# Altium footprint library ICs And Semiconductors SMD.PcbLib: 943 footprints (part 13 of 60) (continued)
## MARKI-MICROWAVE_EZ-Style Doubler [mm] "Marki microwave EZ Style Doubler Outline, 15.24mm L X 8.13mm W X 4.3mm H Body" (continued)
  text "F" at -9.7,-0.6 h1.2
Mechanical 15:
  lines w0.05: -8.378,-4.822 8.378,-4.822 8.378,4.822 -8.378,4.822 -8.378,-4.822
Drill Drawing:
  lines w0.1: -7.62,-4.064 7.62,-4.064 7.62,4.064 -7.62,4.064 -7.62,-4.064
  text "Filled and Capped Via Area" at -7.5,4.4 h0.6
  text "(D=0.35mm)" at -2.3,-3.1 h0.6
3D body "MARKI-MICROWAVE_EZ-Style Doubler.stp": height 4.3, standoff 0, extent -7.62,-4.064 7.62,4.064

## MARKI-MICROWAVE_EZ-Style Mixer [mm] "Marki microwave EZ Style Mixer Outline, 15.24mm L X 8.13mm W X 4.3mm H Body"
height 4.3
pads (18):
  rect 0.889x0.508 smd: 1(-7.683,0) 2(7.684,0)
  rect 0.508x0.889 smd: 3(0,-4.128)
  round 2.35 hole 1.85: 4(-6.35,-2.794) 4(-6.35,2.794) 4(-3.429,-1.27) 4(-3.429,1.27) 4(0,-1.27) 4(0,1.27) 4(3.429,-1.27) 4(3.429,1.27) 4(6.35,-2.794) 4(6.35,2.794)
  rect 7.366x3.81 smd: 4(-4.445,-2.667) 4(4.445,-2.667)
  rect 1.524x2.54 smd: 4(0,-2.032)
  rect 13.716x1.524 smd: 4(0,0)
  rect 16.256x3.81 smd: 4(0,2.667)
via -6.477,1.524 diameter 0.6 hole 0.35
via -7.239,1.905 diameter 0.6 hole 0.35
via -7.239,1.143 diameter 0.6 hole 0.35
via -6.477,0.762 diameter 0.6 hole 0.35
via -6.477,0 diameter 0.6 hole 0.35
via -6.477,-0.762 diameter 0.6 hole 0.35
via -7.239,-1.143 diameter 0.6 hole 0.35
via -6.477,-1.524 diameter 0.6 hole 0.35
via -7.239,-1.905 diameter 0.6 hole 0.35
via -4.953,-3.683 diameter 0.6 hole 0.35
via -4.191,-3.683 diameter 0.6 hole 0.35
via -3.429,-3.683 diameter 0.6 hole 0.35
via -2.667,-3.683 diameter 0.6 hole 0.35
via -1.905,-3.683 diameter 0.6 hole 0.35
via -1.143,-3.683 diameter 0.6 hole 0.35
via -1.524,-2.921 diameter 0.6 hole 0.35
via -0.762,-2.921 diameter 0.6 hole 0.35
via 0,-2.921 diameter 0.6 hole 0.35
via 0.762,-2.921 diameter 0.6 hole 0.35
via 1.524,-2.921 diameter 0.6 hole 0.35
via 1.143,-3.683 diameter 0.6 hole 0.35
via 1.905,-3.683 diameter 0.6 hole 0.35
via 2.667,-3.683 diameter 0.6 hole 0.35
via 3.429,-3.683 diameter 0.6 hole 0.35
via 4.191,-3.683 diameter 0.6 hole 0.35
via 4.953,-3.683 diameter 0.6 hole 0.35
via 7.239,-1.905 diameter 0.6 hole 0.35
via 6.477,-1.524 diameter 0.6 hole 0.35
via 7.239,-1.143 diameter 0.6 hole 0.35
via 6.477,-0.762 diameter 0.6 hole 0.35
via 6.477,0 diameter 0.6 hole 0.35
via 6.477,0.762 diameter 0.6 hole 0.35
via 6.477,1.524 diameter 0.6 hole 0.35
via 7.239,1.143 diameter 0.6 hole 0.35
via 7.239,1.905 diameter 0.6 hole 0.35
via 4.953,3.683 diameter 0.6 hole 0.35
via 4.191,3.683 diameter 0.6 hole 0.35
via 3.429,3.683 diameter 0.6 hole 0.35
via 2.667,3.683 diameter 0.6 hole 0.35
via 1.905,3.683 diameter 0.6 hole 0.35
via 1.143,3.683 diameter 0.6 hole 0.35
via -1.143,3.683 diameter 0.6 hole 0.35
via -1.905,3.683 diameter 0.6 hole 0.35
via -2.667,3.683 diameter 0.6 hole 0.35
via -3.429,3.683 diameter 0.6 hole 0.35
via -4.191,3.683 diameter 0.6 hole 0.35
via -4.953,3.683 diameter 0.6 hole 0.35
via -0.381,3.683 diameter 0.6 hole 0.35
via 0.381,3.683 diameter 0.6 hole 0.35
Top Layer:
  region: -8.128,-4.572 -8.128,-0.762 -6.858,-0.762 -6.858,0.762 -8.128,0.762 -8.128,4.572 8.128,4.572 8.128,0.762 6.858,0.762 6.858,-0.762 8.128,-0.762 8.128,-4.572 0.762,-4.572 0.762,-3.302 -0.762,-3.302 -0.762,-4.572
Top Overlay:
  lines w0.2: -8.428,-0.762 -8.428,-4.872 -0.762,-4.872 ; -8.428,0.762 -8.428,4.872 8.428,4.872 8.428,0.762 ; 0.762,-4.872 8.428,-4.872 8.428,-0.762
  text "R" at 9,-0.6 h1.2
  text "L" at -9.8,-0.6 h1.2
  text "I2" at -0.9,-6.6 h1.2
Mechanical 8:
  drawing of 293 lines, arcs and shapes, not listed
Mechanical 14:
  circle w0.1: c-6.35,2.794 r0.925
  circle w0.1: c6.35,-2.794 r0.925
  circle w0.1: c-6.35,-2.794 r1.2
  circle w0.1: c6.35,2.794 r1.2
  lines w0.1: -7.62,-1.394 -6.35,-1.394 cw(c-6.35,-2.794) -4.95,-2.794 -4.95,-4.064 ; -7.62,-1.394 -7.62,1.394 ; -7.62,-1.394 -7.62,-2.794 ccw(c-6.35,-2.794) -6.35,-4.064 -4.95,-4.064 ; -7.62,1.394 -7.62,2.794 cw(c-6.35,2.794) -6.35,4.064 -4.95,4.064 ; -7.62,1.394 -6.35,1.394 ccw(c-6.35,2.794) -4.95,2.794 -4.95,4.064 ; -4.95,-4.064 4.95,-4.064 ; -4.95,4.064 4.95,4.064 ; 4.95,-4.064 6.35,-4.064 ccw(c6.35,-2.794) 7.62,-2.794 7.62,-1.394 ; 4.95,-4.064 4.95,-2.794 cw(c6.35,-2.794) 6.35,-1.394 7.62,-1.394 ; 4.95,4.064 4.95,2.794 ccw(c6.35,2.794) 6.35,1.394 7.62,1.394 ; 4.95,4.064 6.35,4.064 cw(c6.35,2.794) 7.62,2.794 7.62,1.394 ; 7.62,-1.394 7.62,1.394 ; -7.123,-3.24 -7.123,-2.348 -6.35,-1.902 -5.577,-2.348 -5.577,-3.24 -6.35,-3.686 -7.123,-3.24 ; 5.577,2.348 5.577,3.24 6.35,3.686 7.123,3.24 7.123,2.348 6.35,1.902 5.577,2.348
  text "L" at -9.8,-0.6 h1.2
  text "R" at 9,-0.6 h1.2
  text "I2" at -0.9,-6.6 h1.2
Mechanical 15:
  lines w0.05: -8.378,-4.822 8.378,-4.822 8.378,4.822 -8.378,4.822 -8.378,-4.822
Drill Drawing:
  lines w0.1: -7.62,-4.064 7.62,-4.064 7.62,4.064 -7.62,4.064 -7.62,-4.064
  text "(D=0.35mm)" at -2.8,2.6 h0.6
  text "Filled and Capped Via Area" at -7.5,4.4 h0.6
3D body "MARKI-MICROWAVE_EZ-Style Mixer.stp": height 4.3, standoff 0, extent -7.62,-4.064 7.62,4.064

## MARKI-MICROWAVE_FLSM1000 [mm] "Marki microwave Case FLSM1000, 25.4mm L X 8.13mm W X 2.794mm H Body"
height 2.794
pads (9):
  round 0.762 smd: 1(-12.446,0) 2(12.446,0)
  round 2.3 hole 1.6: 3(-11.43,-2.795) 3(-11.43,2.795) 3(11.43,-2.795) 3(11.43,2.795)
  rect 26.416x3.937 smd: 3(0,-2.604) 3(0,2.604)
  rect 23.622x1.27 smd: 3(0,0)
via -10.16,3.937 diameter 1.05 hole 0.75
via -7.62,3.937 diameter 1.05 hole 0.75
via -5.08,3.937 diameter 1.05 hole 0.75
via -2.54,3.937 diameter 1.05 hole 0.75
via 0,3.937 diameter 1.05 hole 0.75
via 2.54,3.937 diameter 1.05 hole 0.75
via 5.08,3.937 diameter 1.05 hole 0.75
via 7.62,3.937 diameter 1.05 hole 0.75
via 10.16,3.937 diameter 1.05 hole 0.75
via 8.89,2.032 diameter 1.05 hole 0.75
via 6.35,2.032 diameter 1.05 hole 0.75
via 3.81,2.032 diameter 1.05 hole 0.75
via 1.27,2.032 diameter 1.05 hole 0.75
via -1.27,2.032 diameter 1.05 hole 0.75
via -3.81,2.032 diameter 1.05 hole 0.75
via -6.35,2.032 diameter 1.05 hole 0.75
via -8.89,2.032 diameter 1.05 hole 0.75
via -11.43,1.016 diameter 1.05 hole 0.75
via -10.16,0 diameter 1.05 hole 0.75
via -7.62,0 diameter 1.05 hole 0.75
via -5.08,0 diameter 1.05 hole 0.75
via -2.54,0 diameter 1.05 hole 0.75
via 0,0 diameter 1.05 hole 0.75
via 2.54,0 diameter 1.05 hole 0.75
via 5.08,0 diameter 1.05 hole 0.75
via 7.62,0 diameter 1.05 hole 0.75
via 10.16,0 diameter 1.05 hole 0.75
via 11.43,1.016 diameter 1.05 hole 0.75
via 11.43,-1.016 diameter 1.05 hole 0.75
via 8.89,-2.032 diameter 1.05 hole 0.75
via 6.35,-2.032 diameter 1.05 hole 0.75
via 3.81,-2.032 diameter 1.05 hole 0.75
via 1.27,-2.032 diameter 1.05 hole 0.75
via -1.27,-2.032 diameter 1.05 hole 0.75
via -3.81,-2.032 diameter 1.05 hole 0.75
via -6.35,-2.032 diameter 1.05 hole 0.75
via -8.89,-2.032 diameter 1.05 hole 0.75
via -11.43,-1.016 diameter 1.05 hole 0.75
via -10.16,-3.937 diameter 1.05 hole 0.75
via -7.62,-3.937 diameter 1.05 hole 0.75
via -5.08,-3.937 diameter 1.05 hole 0.75
via -2.54,-3.937 diameter 1.05 hole 0.75
via 0,-3.937 diameter 1.05 hole 0.75
via 2.54,-3.937 diameter 1.05 hole 0.75
via 5.08,-3.937 diameter 1.05 hole 0.75
via 7.62,-3.937 diameter 1.05 hole 0.75
via 10.16,-3.937 diameter 1.05 hole 0.75
Top Layer:
  region: -13.208,-4.572 -13.208,-0.635 -12.446,-0.635 -12.322,-0.623 -12.093,-0.528 -11.918,-0.353 -11.823,-0.124 -11.823,0.124 -11.918,0.353 -12.093,0.528 -12.322,0.623 -12.446,0.635 -13.208,0.635 -13.208,4.572 13.208,4.572 13.208,0.635 12.446,0.635 12.322,0.623 12.093,0.528 11.918,0.353 11.823,0.124 11.823,-0.124 11.918,-0.353 12.093,-0.528 12.322,-0.623 12.446,-0.635 13.208,-0.635 13.208,-4.572
Top Overlay:
  lines w0.2: -13.508,-0.635 -13.508,-4.872 13.508,-4.872 13.508,-0.635 ; -13.508,0.635 -13.508,4.872 13.508,4.872 13.508,0.635
Mechanical 8:
  drawing of 231 lines, arcs and shapes, not listed
Mechanical 14:
  circle w0.1: c11.43,2.795 r0.762
  circle w0.1: c11.43,-2.795 r0.762
  circle w0.1: c-11.43,-2.795 r0.762
  circle w0.1: c-11.43,2.795 r0.762
  lines w0.1: -12.7,-3.465 ccw(c-12.1,-3.465) -12.1,-4.065 12.1,-4.065 ccw(c12.1,-3.465) 12.7,-3.465 12.7,-0.635 12.446,-0.635 cw(c12.446,0) 12.446,0.635 12.7,0.635 12.7,3.465 ccw(c12.1,3.465) 12.1,4.065 -12.1,4.065 ccw(c-12.1,3.465) -12.7,3.465 -12.7,0.635 -12.446,0.635 cw(c-12.446,0) -12.446,-0.635 -12.7,-0.635 -12.7,-3.465
Mechanical 15:
  lines w0.05: -13.458,-4.822 13.458,-4.822 13.458,4.822 -13.458,4.822 -13.458,-4.822
Drill Drawing:
  lines w0.1: -13.208,-4.572 -13.208,4.572 13.208,4.572 13.208,-4.572 -13.208,-4.572
  text "Filled and Capped Via (0.75mm) Area" at -10.1,2.7 h0.6
3D body "MARKI-MICROWAVE_FLSM1000.stp": height 2.79, standoff 0, extent -12.7,-4.065 12.7,4.065

## MARKI-MICROWAVE_FLSM1600 [mm] "Marki microwave Case FLSM1600, 40.64mm L X 8.13mm W X 2.794mm H Body"
height 2.794
pads (9):
  round 0.762 smd: 1(-20.066,0) 2(20.066,0)
  round 2.3 hole 1.6: 3(-19.05,-2.795) 3(-19.05,2.795) 3(19.05,-2.795) 3(19.05,2.795)
  rect 41.656x3.937 smd: 3(0,-2.604) 3(0,2.604)
  rect 38.883x1.27 smd: 3(0,0)
via 17.145,-3.937 diameter 1.05 hole 0.75
via 13.335,-3.937 diameter 1.05 hole 0.75
via 9.525,-3.937 diameter 1.05 hole 0.75
via 5.715,-3.937 diameter 1.05 hole 0.75
via 1.905,-3.937 diameter 1.05 hole 0.75
via -1.905,-3.937 diameter 1.05 hole 0.75
via -5.715,-3.937 diameter 1.05 hole 0.75
via -9.525,-3.937 diameter 1.05 hole 0.75
via -13.335,-3.937 diameter 1.05 hole 0.75
via -17.145,-3.937 diameter 1.05 hole 0.75
via -15.24,-2.032 diameter 1.05 hole 0.75
via -11.43,-2.032 diameter 1.05 hole 0.75
via -7.62,-2.032 diameter 1.05 hole 0.75
via -3.81,-2.032 diameter 1.05 hole 0.75
via -0.5,-2.032 diameter 1.05 hole 0.75
via 3.81,-2.032 diameter 1.05 hole 0.75
via 7.62,-2.032 diameter 1.05 hole 0.75
via 11.43,-2.032 diameter 1.05 hole 0.75
via 15.24,-2.032 diameter 1.05 hole 0.75
via 19.05,-1.016 diameter 1.05 hole 0.75
via 17.145,0 diameter 1.05 hole 0.75
via 13.335,0 diameter 1.05 hole 0.75
via 9.525,0 diameter 1.05 hole 0.75
via 5.715,0 diameter 1.05 hole 0.75
via 1.905,0 diameter 1.05 hole 0.75
via -1.905,0 diameter 1.05 hole 0.75
via -5.715,0 diameter 1.05 hole 0.75
via -9.525,0 diameter 1.05 hole 0.75
via -13.335,0 diameter 1.05 hole 0.75
via -17.145,0 diameter 1.05 hole 0.75
via -19.05,-1.016 diameter 1.05 hole 0.75
via -19.05,1.016 diameter 1.05 hole 0.75
via -15.24,2.032 diameter 1.05 hole 0.75
via -11.43,2.032 diameter 1.05 hole 0.75
via -7.62,2.032 diameter 1.05 hole 0.75
via -3.81,2.032 diameter 1.05 hole 0.75
via 0,2.032 diameter 1.05 hole 0.75
via 3.81,2.032 diameter 1.05 hole 0.75
via 7.62,2.032 diameter 1.05 hole 0.75
via 11.43,2.032 diameter 1.05 hole 0.75
via 15.24,2.032 diameter 1.05 hole 0.75
via 19.05,1.016 diameter 1.05 hole 0.75
via 17.145,3.937 diameter 1.05 hole 0.75
via 13.335,3.937 diameter 1.05 hole 0.75
via 9.525,3.937 diameter 1.05 hole 0.75
via 5.715,3.937 diameter 1.05 hole 0.75
via 1.905,3.937 diameter 1.05 hole 0.75
via -1.905,3.937 diameter 1.05 hole 0.75
via -5.715,3.937 diameter 1.05 hole 0.75
via -9.525,3.937 diameter 1.05 hole 0.75
via -13.335,3.937 diameter 1.05 hole 0.75
via -17.145,3.937 diameter 1.05 hole 0.75
Top Layer:
  region: -20.828,-4.572 -20.828,-0.635 -20.066,-0.635 -19.942,-0.623 -19.713,-0.528 -19.538,-0.353 -19.443,-0.124 -19.443,0.124 -19.538,0.353 -19.713,0.528 -19.942,0.623 -20.066,0.635 -20.828,0.635 -20.828,4.572 20.828,4.572 20.828,0.635 20.066,0.635 19.942,0.623 19.713,0.528 19.538,0.353 19.443,0.124 19.443,-0.124 19.538,-0.353 19.713,-0.528 19.942,-0.623 20.066,-0.635 20.828,-0.635 20.828,-4.572
Top Overlay:
  lines w0.2: -21.128,-0.635 -21.128,-4.872 21.128,-4.872 21.128,-0.635 ; -21.128,0.635 -21.128,4.872 21.128,4.872 21.128,0.635
Mechanical 8:
  drawing of 256 lines, arcs and shapes, not listed
Mechanical 14:
  circle w0.1: c19.05,2.795 r0.762
  circle w0.1: c19.05,-2.795 r0.762
  circle w0.1: c-19.05,-2.795 r0.762
  circle w0.1: c-19.05,2.795 r0.762
  lines w0.1: -20.32,-3.465 ccw(c-19.72,-3.465) -19.72,-4.065 19.72,-4.065 ccw(c19.72,-3.465) 20.32,-3.465 20.32,-0.635 20.066,-0.635 cw(c20.066,0) 20.066,0.635 20.32,0.635 20.32,3.465 ccw(c19.72,3.465) 19.72,4.065 -19.72,4.065 ccw(c-19.72,3.465) -20.32,3.465 -20.32,0.635 -20.066,0.635 cw(c-20.066,0) -20.066,-0.635 -20.32,-0.635 -20.32,-3.465
Mechanical 15:
  lines w0.1: -21.078,-4.822 21.078,-4.822 21.078,4.822 -21.078,4.822 -21.078,-4.822
Drill Drawing:
  lines w0.1: -20.828,-4.572 -20.828,4.572 20.828,4.572 20.828,-4.572 -20.828,-4.572
  text "Filled and Capped Via (0.75mm) Area" at -10.1,2.7 h0.6
3D body "MARKI-MICROWAVE_FLSM1600.stp": height 2.79, standoff 0, extent -20.32,-4.065 20.32,4.065

## MAXIM_TSOC-6 [mm] "MAXIM TSOC Case, 6 Pins, Pitch 1.27mm, 1.3mm W X 2.9mm L X 1.1mm H"
height 1.5
pads (6):
  rect 1.5x0.6 smd: 1(-2,1.27) 2(-2,0) 3(-2,-1.27) 4(2,-1.27) 5(2,0) 6(2,1.27)
Top Overlay:
  circle w0.25: c-3.3,1.27 r0.125
  lines w0.2: -1.945,-1.92 -1.945,-2 1.945,-2 1.945,-1.92 ; -1.945,1.92 -1.945,2 1.945,2 1.945,1.92
Mechanical 8:
  lines w0.05: -0.5,0 0,0 ; 0,-0.5 0,0 ; 0,0.5 0,0 ; 0.5,0 0,0 ; -2.75,-1.57 -1.25,-1.57 -1.25,-0.97 -2.75,-0.97 ; -2.75,-1.57 -2.75,-0.97 ; -2.75,-1.57 -2,-1.27 -2.75,-0.97 ; -2.75,-0.3 -1.25,-0.3 -1.25,0.3 -2.75,0.3 ; -2.75,-0.3 -2.75,0.3 ; -2.75,-0.3 -2,0 -2.75,0.3 ; -2.75,0.97 -1.25,0.97 -1.25,1.57 -2.75,1.57 ; -2.75,0.97 -2.75,1.57 ; -2.75,0.97 -2,1.27 -2.75,1.57 ; 2.75,-1.57 1.25,-1.57 1.25,-0.97 2.75,-0.97 ; 2.75,-1.57 2.75,-0.97 ; 2.75,-1.57 2,-1.27 2.75,-0.97 ; 2.75,-0.3 1.25,-0.3 1.25,0.3 2.75,0.3 ; 2.75,-0.3 2.75,0.3 ; 2.75,-0.3 2,0 2.75,0.3 ; 2.75,0.97 1.25,0.97 1.25,1.57 2.75,1.57 ; 2.75,0.97 2.75,1.57 ; 2.75,0.97 2,1.27 2.75,1.57
Mechanical 14:
  circle w0.1: c-1.195,1.25 r0.25
  lines w0.1: -1.945,-1.515 -2.36,-1.515 -2.36,-1.025 -1.945,-1.025 ; -1.945,-0.245 -2.36,-0.245 -2.36,0.245 -1.945,0.245 ; -1.945,1.025 -2.36,1.025 -2.36,1.515 -1.945,1.515 ; 1.945,-1.515 2.36,-1.515 2.36,-1.025 1.945,-1.025 ; 1.945,-0.245 2.36,-0.245 2.36,0.245 1.945,0.245 ; 1.945,1.025 2.36,1.025 2.36,1.515 1.945,1.515 ; -1.945,-2 1.945,-2 1.945,2 -1.945,2 -1.945,-2
Mechanical 15:
  lines w0.05: -3,-2.25 3,-2.25 3,2.25 -3,2.25 -3,-2.25
3D body "MAXIM_TSOC-6.stp": height 1.5, standoff 0, extent -2.36,-2 2.36,2

## MICROCHIP_H3QFN88-52LD-PL-3 [mm] "MICROCHIP_H3QFN88-52LD-PL-3, 0.50mm Pitch, Square, 52 Pin, 8mm L X 8mm W X 3mm H Body"
height 3
pads (49):
  rect 0.8x0.25 smd: 1(-3.8,3.5) 2(-3.8,3) 4(-3.8,2) 5(-3.8,1.5) 6(-3.8,1) 8(-3.8,0) 9(-3.8,-0.5) 10(-3.8,-1) 12(-3.8,-2) 13(-3.8,-2.5) 14(-3.8,-3) 15(-3.8,-3.5) 27(3.8,-3.5) 28(3.8,-3) 29(3.8,-2.5) 30(3.8,-2) 31(3.8,-1.5) 32(3.8,-1) 33(3.8,-0.5) 34(3.8,0) 35(3.8,0.5) 36(3.8,1) 37(3.8,1.5) 38(3.8,2) 39(3.8,2.5) 40(3.8,3) 41(3.8,3.5)
  rect 0.25x0.8 smd: 16(-2.5,-3.8) 17(-2,-3.8) 18(-1.5,-3.8) 19(-1,-3.8) 20(-0.5,-3.8) 21(0,-3.8) 23(1,-3.8) 24(1.5,-3.8) 25(2,-3.8) 26(2.5,-3.8) 42(2.5,3.8) 43(2,3.8) 44(1.5,3.8) 45(1,3.8) 47(0,3.8) 48(-0.5,3.8) 49(-1,3.8) 50(-1.5,3.8) 51(-2,3.8) 52(-2.5,3.8)
  rect 2.1x1.675 smd: 53(1.7,1.363)
  rect 2.1x1.15 smd: 54(1.7,-2.15)
Top Layer:
  lines w0.05: 1.7,0.525 1.7,0.525
Top Layer keep-out:
  region: -4.2,-1.625 -4.2,-1.375 -3.15,-1.375 -3.15,0.375 -4.2,0.375 -4.2,0.625 -3.15,0.625 -3.15,2.375 -4.2,2.375 -4.2,2.625 -3.15,2.625 -3.15,3.12 0.15,3.12 0.15,0.025 3.15,0.025 3.15,-1.075 0.15,-1.075 0.15,-3.12 -3.15,-3.12 -3.15,-1.625
  region: 0.375,-4.2 0.625,-4.2 0.625,-3.12 0.375,-3.12
  region: 0.375,3.12 0.625,3.12 0.625,4.2 0.375,4.2
Top Overlay:
  circle w0.25: c-4.425,4.4 r0.125
  lines w0.2: -4,-3.975 -4,-4 -2.975,-4 ; -4,3.975 -4,4 -2.975,4 ; 2.975,-4 4,-4 4,-3.975 ; 2.975,4 4,4 4,3.975
Mechanical 8:
  drawing of 381 lines, arcs and shapes, not listed
Mechanical 14:
  lines w0.1: -4,3 -3,4 ; -4,3.1 -3.1,4 ; -4,3.2 -3.2,4 ; -4,3.3 -3.3,4 ; -4,3.4 -3.4,4 ; -4,3.5 -3.5,4 ; -4,3.6 -3.6,4 ; -4,3.7 -3.7,4 ; -4,3.8 -3.8,4 ; -4,3.9 -3.9,4 ; -4,-4 4,-4 4,4 -4,4 -4,-4
Mechanical 15:
  lines w0.05: -4.45,-4.45 4.45,-4.45 4.45,4.45 -4.45,4.45 -4.45,-4.45
3D body "MICROCHIP_H3QFN88-52LD-PL-3.stp": height 3, standoff 0, extent -4,-4 4,4

## MICROCHIP_P2QFN-54 [mm] "MICROCHIP P2QFN106-54LD-PL-1, 0.50mm Pitch, Rectangular, 54 Pin, 6mm L X 10mm W X 2.1mm H Body"
height 2.1
pads (51):
  rect 0.6x0.23 smd: 1(-2.9,4.5) 2(-2.9,4) 3(-2.9,3.5) 4(-2.9,3) 5(-2.9,2.5) 6(-2.9,2) 7(-2.9,1.5) 8(-2.9,1) 9(-2.9,0.5) 11(-2.9,-0.5) 12(-2.9,-1) 13(-2.9,-1.5) 14(-2.9,-2) 15(-2.9,-2.5) 16(-2.9,-3) 17(-2.9,-3.5) 18(-2.9,-4) 19(-2.9,-4.5) 28(2.9,-4.5) 29(2.9,-4) 30(2.9,-3.5) 31(2.9,-3) 32(2.9,-2.5) 33(2.9,-2) 34(2.9,-1.5) 35(2.9,-1) 36(2.9,-0.5) 37(2.9,0) 38(2.9,0.5) 39(2.9,1) 41(2.9,2) 42(2.9,2.5) 43(2.9,3) 44(2.9,3.5) 45(2.9,4) 46(2.9,4.5)
  rect 0.23x0.6 smd: 20(-1.75,-4.9) 21(-1.25,-4.9) 23(-0.25,-4.9) 24(0.25,-4.9) 26(1.25,-4.9) 27(1.75,-4.9) 47(1.75,4.9) 48(1.25,4.9) 49(0.75,4.9) 50(0.25,4.9) 51(-0.25,4.9) 52(-0.75,4.9) 53(-1.25,4.9) 54(-1.75,4.9)
  rect 0.73x5.83 smd: 55(0.175,-1.205)
Top Layer keep-out:
  region: 0.635,-5.2 0.635,-4.3 0.865,-4.3 0.865,-5.2
  region: -0.865,-5.2 -0.865,-4.1 -2.1,-4.1 -2.1,-0.115 -3.2,-0.115 -3.2,0.115 -2.1,0.115 -2.1,4.1 2.1,4.1 2.1,1.615 3.2,1.615 3.2,1.385 2.1,1.385 2.1,-4.1 0.983,-4.1 0.983,2.164 -0.635,2.164 -0.635,-5.2
Top Overlay:
  circle w0.25: c-3.4,5.4 r0.125
  lines w0.2: -3.025,-4.965 -3.025,-5.025 -2.215,-5.025 ; -3.025,4.965 -3.025,5.025 -2.215,5.025 ; 2.215,-5.025 3.025,-5.025 3.025,-4.965 ; 2.215,5.025 3.025,5.025 3.025,4.965
Mechanical 8:
  drawing of 375 lines, arcs and shapes, not listed
Mechanical 14:
  lines w0.1: -3.025,4.025 -2.025,5.025 ; -3.025,4.125 -2.125,5.025 ; -3.025,4.225 -2.225,5.025 ; -3.025,4.325 -2.325,5.025 ; -3.025,4.425 -2.425,5.025 ; -3.025,4.525 -2.525,5.025 ; -3.025,4.625 -2.625,5.025 ; -3.025,4.725 -2.725,5.025 ; -3.025,4.825 -2.825,5.025 ; -3.025,4.925 -2.925,5.025 ; -3.025,-5.025 -3.025,5.025 3.025,5.025 3.025,-5.025 -3.025,-5.025
Mechanical 15:
  lines w0.05: -3.45,-5.45 3.45,-5.45 3.45,5.45 -3.45,5.45 -3.45,-5.45
3D body "MICROCHIP_P2QFN-54.stp": height 2.1, standoff 0, extent -3.025,-5.025 3.025,5.025

## MINI-CIRCUITS_AF320 [mm] "MINI-CIRCUITS AF320 Case"
height 1.45
pads (4):
  rect 1.52x1.52 smd: 1(-2.16,0) 3(2.16,0)
  rect 2.03x1.65 smd: 2(0,-2.095) 4(0,2.095)
Top Overlay:
  circle w0.2: c0,0 r0.865
  circle w0.25: c-2.225,1.25 r0.125
  lines w0.2: -0.89,-0.255 -1.05,-0.255 -1.05,0.255 -0.89,0.255 ; -0.51,-0.749 -0.51,-0.92 0.51,-0.92 0.51,-0.749 ; -0.51,0.749 -0.51,0.92 0.51,0.92 0.51,0.749 ; 0.89,-0.255 1.05,-0.255 1.05,0.255 0.89,0.255 ; -0.89,-0.369 -0.369,-0.89 0.369,-0.89 0.89,-0.369 0.89,0.369 0.369,0.89 -0.369,0.89 -0.89,0.369 -0.89,-0.369
Mechanical 8:
  lines w0.1: -2.66,0 -2.16,0 ; -2.16,-0.5 -2.16,0 ; -2.16,0.5 -2.16,0 ; -1.66,0 -2.16,0 ; -0.5,-2.095 0,-2.095 ; -0.5,0 0,0 ; -0.5,2.095 0,2.095 ; 0,-2.595 0,-2.095 ; 0,-1.595 0,-2.095 ; 0,-1.27 0,1.27 ; 0,-0.5 0,0 ; 0,0.5 0,0 ; 0,1.595 0,2.095 ; 0,2.595 0,2.095 ; 0.5,-2.095 0,-2.095 ; 0.5,0 0,0 ; 0.5,2.095 0,2.095 ; 1.66,0 2.16,0 ; 2.16,-0.5 2.16,0 ; 2.16,0.5 2.16,0 ; 2.66,0 2.16,0 ; -2.92,-0.76 -2.92,0.76 -1.4,0.76 -1.4,-0.76 -2.92,-0.76 ; -1.015,-2.92 1.015,-2.92 1.015,-1.27 -1.015,-1.27 -1.015,-2.92 ; -1.015,1.27 1.015,1.27 1.015,2.92 -1.015,2.92 -1.015,1.27 ; 1.4,-0.76 1.4,0.76 2.92,0.76 2.92,-0.76 1.4,-0.76
Mechanical 14:
  circle w0.1: c0,0 r0.865
  lines w0.1: -2.31,-0.255 -1.8,0.255 ; -2.21,-0.255 -1.7,0.255 ; -2.11,-0.255 -1.6,0.255 ; -2.01,-0.255 -1.5,0.255 ; -0.89,-0.255 -2.54,-0.255 -2.03,0.255 -0.89,0.255 ; -0.51,-0.749 -0.51,-2.54 0.51,-2.54 0.51,-0.749 ; -0.51,0.749 -0.51,2.54 0.51,2.54 0.51,0.749 ; 0.89,-0.255 2.54,-0.255 2.54,0.255 0.89,0.255 ; -2.41,-0.255 -1.9,0.255 -2.41,-0.255 ; -0.89,-0.369 -0.369,-0.89 0.369,-0.89 0.89,-0.369 0.89,0.369 0.369,0.89 -0.369,0.89 -0.89,0.369 -0.89,-0.369
Mechanical 15:
  lines w0.05: -3.17,-1.01 -3.17,1.01 -1.265,1.01 -1.265,3.17 1.265,3.17 1.265,1.01 3.17,1.01 3.17,-1.01 1.265,-1.01 1.265,-3.17 -1.265,-3.17 -1.265,-1.01 -3.17,-1.01
3D body "MINI-CIRCUITS_AF320.stp": height 1.35, standoff 0, extent -2.54,-2.54 2.54,2.54

## MINI-CIRCUITS_AH202-1 [mm] "MINI-CIRCUITS AH202-1 Case, Body 12.7mm L X 9.65mm W X 6.35mm H"
height 6.35
pads (10):
  rect 3.23x1.88 smd: 1(3.643,3.81) 4(3.643,-3.81) 5(-3.643,-3.81) 8(-3.643,3.81)
  rect 2.67x10.92 smd paste-1.35 mask-1.35: 2(0,0)
  rect 9.65x3.56 smd paste-1.8 mask-1.8: 2(0,0)
  rect 3.23x2 smd: 2(3.643,0.83) 3(3.643,-0.83) 6(-3.643,-0.83) 7(-3.643,0.83)
Top Overlay:
  lines w0.2: -4.825,-5.1 -4.825,-6.35 4.825,-6.35 4.825,-5.1 ; -4.825,-2.52 -4.825,-2.18 ; -4.825,2.18 -4.825,2.52 ; -4.825,5.1 -4.825,6.35 4.825,6.35 4.825,5.1 ; -3.935,-5.1 -3.935,-5.36 ccw(c-3.835,-5.36) -3.835,-5.46 -1.685,-5.46 ; -3.935,-2.52 -3.935,-2.18 ; -3.935,2.18 -3.935,2.52 ; -3.935,5.1 -3.935,5.36 cw(c-3.835,5.36) -3.835,5.46 -1.685,5.46 ; 1.685,-5.46 3.835,-5.46 ccw(c3.835,-5.36) 3.935,-5.36 3.935,-5.1 ; 1.685,5.46 3.835,5.46 cw(c3.835,5.36) 3.935,5.36 3.935,5.1 ; 3.935,-2.52 3.935,-2.18 ; 3.935,2.18 3.935,2.52 ; 4.825,-2.52 4.825,-2.18 ; 4.825,2.18 4.825,2.52
Mechanical 8:
  lines w0.05: -4.143,-3.81 -3.643,-3.81 ; -4.143,-0.83 -3.643,-0.83 ; -4.143,0 -3.643,0 ; -4.143,0.83 -3.643,0.83 ; -4.143,3.81 -3.643,3.81 ; -3.643,-4.31 -3.643,-3.81 ; -3.643,-3.31 -3.643,-3.81 ; -3.643,-1.33 -3.643,-0.83 ; -3.643,-0.5 -3.643,0 ; -3.643,-0.33 -3.643,-0.83 ; -3.643,0.33 -3.643,0.83 ; -3.643,0.5 -3.643,0 ; -3.643,1.33 -3.643,0.83 ; -3.643,3.31 -3.643,3.81 ; -3.643,4.31 -3.643,3.81 ; -3.143,-3.81 -3.643,-3.81 ; -3.143,-0.83 -3.643,-0.83 ; -3.143,0 -3.643,0 ; -3.143,0.83 -3.643,0.83 ; -3.143,3.81 -3.643,3.81 ; -0.5,0 0,0 ; 0,-0.5 0,0 ; 0,0.5 0,0 ; 0.5,0 0,0 ; 3.143,-3.81 3.643,-3.81 ; 3.143,-0.83 3.643,-0.83 ; 3.143,0 3.643,0 ; 3.143,0.83 3.643,0.83 ; 3.143,3.81 3.643,3.81 ; 3.643,-4.31 3.643,-3.81 ; 3.643,-3.31 3.643,-3.81 ; 3.643,-1.33 3.643,-0.83 ; 3.643,-0.5 3.643,0 ; 3.643,-0.33 3.643,-0.83 ; 3.643,0.33 3.643,0.83 ; 3.643,0.5 3.643,0 ; 3.643,1.33 3.643,0.83 ; 3.643,3.31 3.643,3.81 ; 3.643,4.31 3.643,3.81 ; 4.143,-3.81 3.643,-3.81 ; 4.143,-0.83 3.643,-0.83 ; 4.143,0 3.643,0 ; 4.143,0.83 3.643,0.83 ; 4.143,3.81 3.643,3.81 ; -4.825,-1.78 -1.335,-1.78 -1.335,-5.46 1.335,-5.46 1.335,-1.78 4.825,-1.78 4.825,1.78 1.335,1.78 1.335,5.46 -1.335,5.46 -1.335,1.78 -4.825,1.78 ; -4.825,-1.78 -4.825,1.78 ; -4.825,-1.78 -4.825,1.78 ; -4.825,-1.78 -4.825,1.78 ; -5.258,-4.75 -5.258,-2.87 -2.028,-2.87 -2.028,-4.75 -5.258,-4.75 ; -5.258,-1.83 -5.258,1.83 -2.028,1.83 -2.028,-1.83 -5.258,-1.83 ; -5.258,2.87 -5.258,4.75 -2.028,4.75 -2.028,2.87 -5.258,2.87 ; 2.028,-4.75 2.028,-2.87 5.258,-2.87 5.258,-4.75 2.028,-4.75 ; 2.028,-1.83 5.258,-1.83 5.258,1.83 2.028,1.83 2.028,-1.83 ; 2.028,2.87 5.258,2.87 5.258,4.75 2.028,4.75 2.028,2.87
Mechanical 14:
  circle w0.1: c-2.868,4.492 r0.411
  lines w0.1: -4.825,-6.35 4.825,-6.35 4.825,-4.124 cw(c4.825,-3.81) 4.825,-3.496 4.825,-1.204 cw(c4.825,-0.89) 4.825,-0.576 4.825,0.576 cw(c4.825,0.89) 4.825,1.204 4.825,3.496 cw(c4.825,3.81) 4.825,4.124 4.825,6.35 -4.825,6.35 -4.825,4.124 cw(c-4.825,3.81) -4.825,3.496 -4.825,1.204 cw(c-4.825,0.89) -4.825,0.576 -4.825,-0.576 cw(c-4.825,-0.89) -4.825,-1.204 -4.825,-3.496 cw(c-4.825,-3.81) -4.825,-4.124 -4.825,-6.35 ; -3.935,-5.36 ccw(c-3.835,-5.36) -3.835,-5.46 3.835,-5.46 ccw(c3.835,-5.36) 3.935,-5.36 3.935,5.36 ccw(c3.835,5.36) 3.835,5.46 -3.835,5.46 ccw(c-3.835,5.36) -3.935,5.36 -3.935,-5.36
Mechanical 15:
  lines w0.05: -5.508,-6.6 -5.508,6.6 5.508,6.6 5.508,-6.6 -5.508,-6.6
3D body "MINI-CIRCUITS_AH202-1.stp": height 6.35, standoff 0, extent -4.825,-6.35 4.825,6.35